# Altium footprint library PCB_OBDH.PcbLib: 34 footprints (part 3 of 3)
Each footprint in its own frame and in the unit in brackets; x right, y up, seen from the top. Pads: shape width x height; smd on the part's side, far side on the other; paste and mask are expansions set on the pad; w line width, h text height; cw(c..) or ccw(c..) is an arc to the next point about the centre after c.
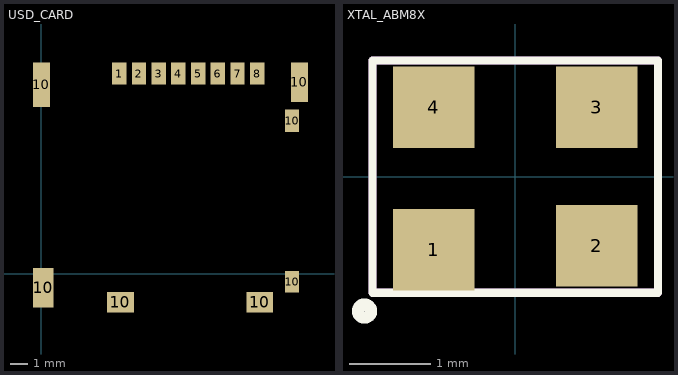
[diagram p2: the footprints below, top view; thin cyan lines are the x and y axes]

## USD_CARD [mm]
pads (15):
  rect 0.8x1.24 smd: 1(4.345,11.176) 2(5.445,11.176) 3(6.545,11.176) 4(7.645,11.176) 5(8.745,11.176) 6(9.845,11.176) 7(10.945,11.176) 8(12.045,11.176) 10(13.985,8.546)
  rect 0.95x2.5 smd: 10(0,10.546)
  rect 1.15x2.2 smd: 10(0.1,-0.784)
  rect 1.5x1.15 smd: 10(4.405,-1.579) 10(12.185,-1.579)
  rect 0.8x1.2 smd: 10(13.985,-0.454)
  rect 0.95x2.2 smd: 10(14.39,10.696)
3D body "5031821852.stp": height 1.43, standoff -0.02, extent -0.256,-1.996 14.684,12.954

## XTAL_ABM8X [mm]
pads (4):
  rect 1x1 smd: 1(-1,-0.9) 2(1,-0.85) 3(1,0.85) 4(-1,0.85)
Top Overlay:
  circle w0.15: c-1.85,-1.65 r0.08
  lines w0.1: -1.75,-1.425 -1.75,1.425 1.75,1.425 1.75,-1.425 -1.75,-1.425
Mechanical 15:
  circle w0.254: c-0.925,-0.85 r0.292
  lines w0.1: -1.75,-1.425 1.75,-1.425 1.75,1.425 -1.75,1.425 -1.75,-1.425
  text ".Designator" at -1.075,-0.05 h0.5
3D body "ABM8X.STEP": height 0.6, standoff 0, extent -1.6,-1.225 1.6,1.275